# Altium schematic symbol library 13-Analog D 数模模数.SchLib: 573 symbols (part 4 of 6)
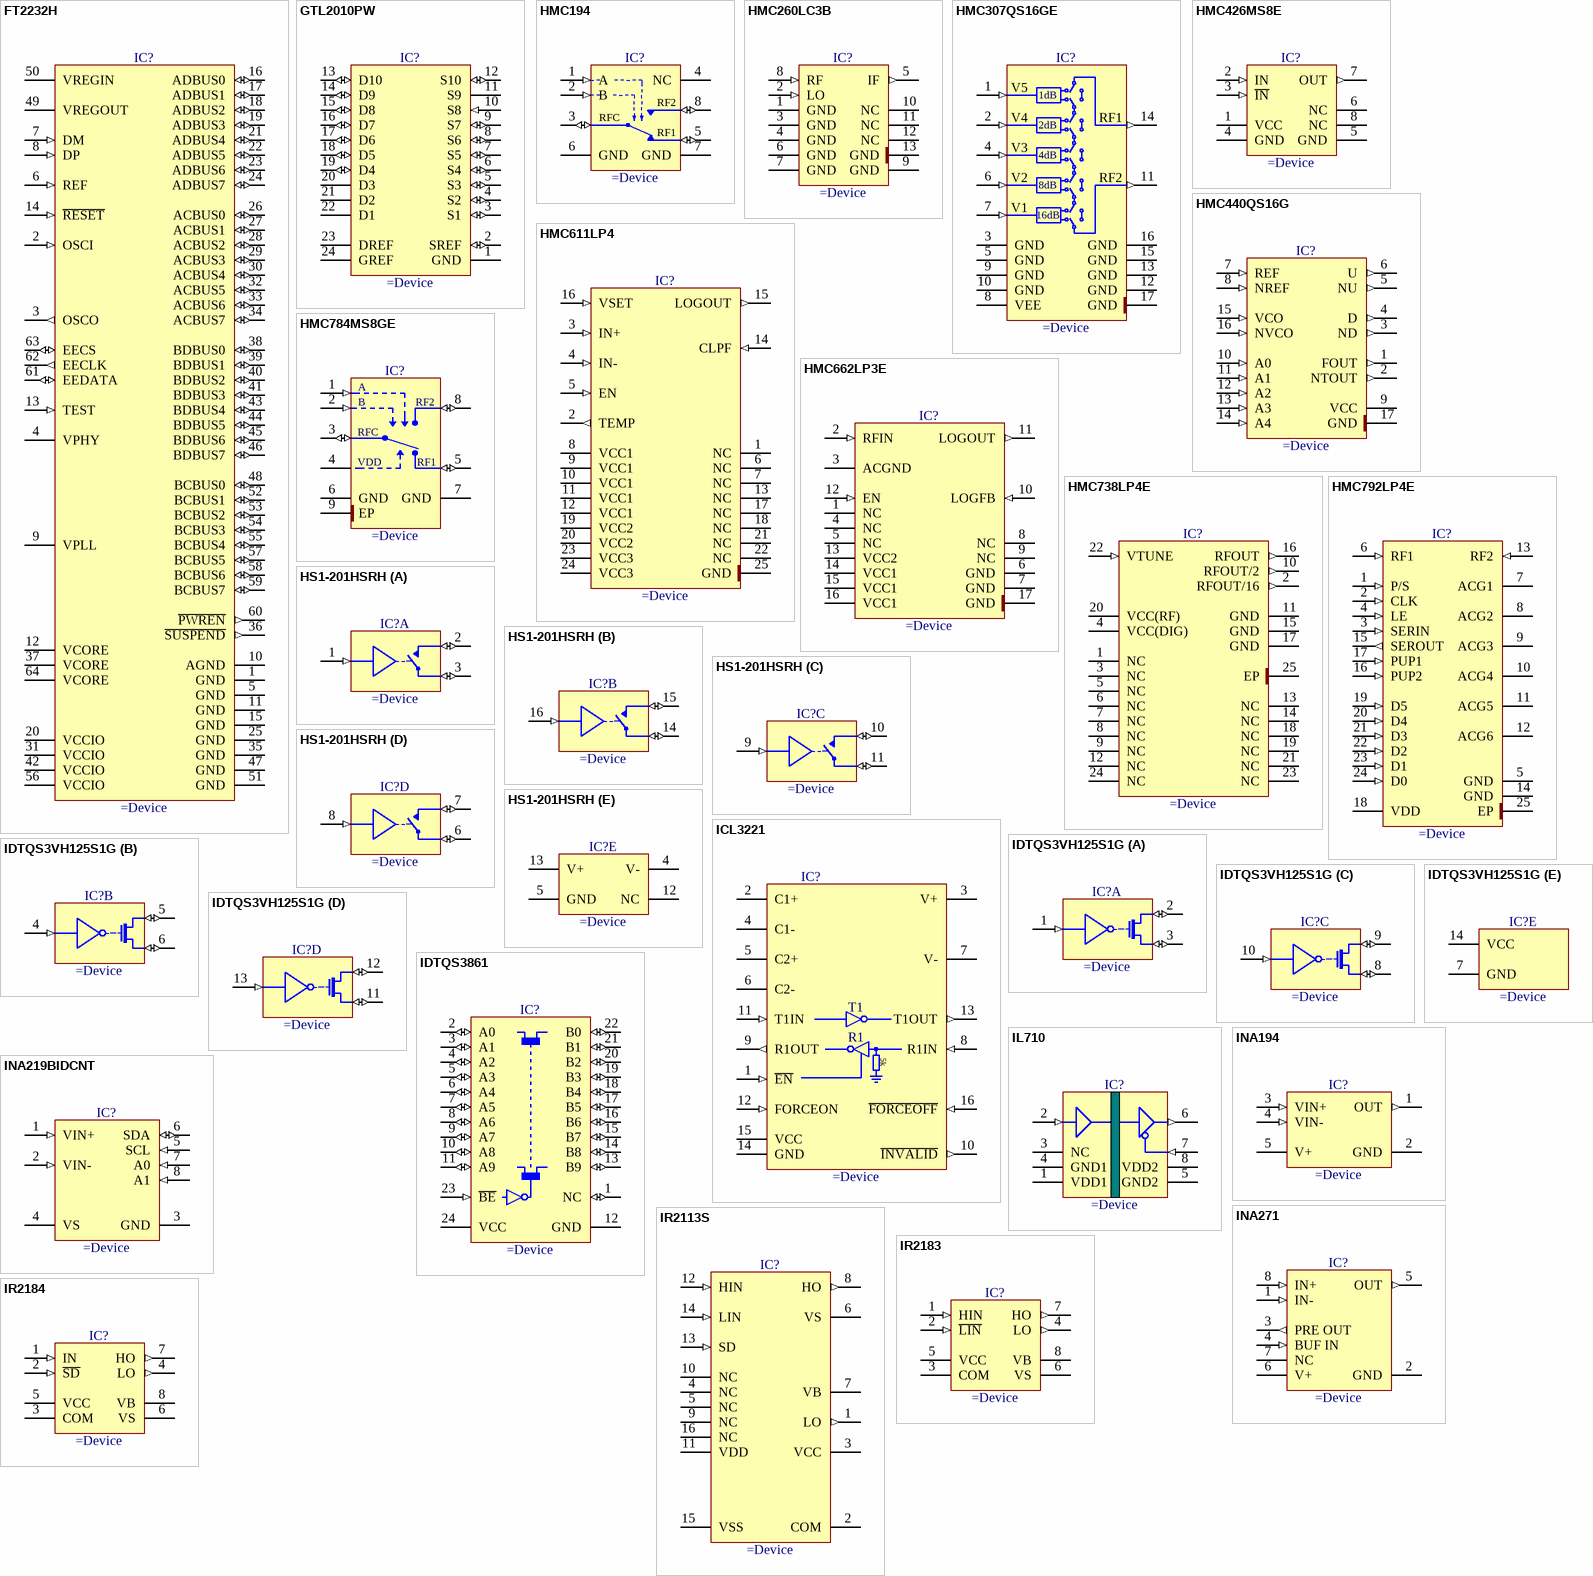
[diagram p43: symbols FT2232H to IR2184]

## HMC194
designator IC?
DC-3GHz GaAs MMIC SPDT Switch
pins: 1 A (in), 2 B (in), 3 RFC (io), 4 NC, 5 RF1 (io), 6 GND (power), 7 GND (power), 8 RF2 (io)

## HMC260LC3B
designator IC?
GaAs MMIC Fundamental Mixer, 14 - 26 GHz
pins: 1 GND (power), 2 LO (in), 3 GND (power), 4 GND (power), 5 IF (out), 6 GND (power), 7 GND (power), 8 RF (in), 9 GND (power), 10 NC, 11 NC, 12 NC, 13 GND (power)

## HMC307QS16GE
designator IC?
DC-4GHz, 1dB LSB GaAs MMIC 5-BIT Digital Attenuator
pins: 1 V5 (in), 2 V4 (in), 3 GND (power), 4 V3 (in), 5 GND (power), 6 V2 (in), 7 V1 (in), 8 VEE (power), 9 GND (power), 10 GND (power), 11 RF2 (out), 12 GND (power), 13 GND (power), 14 RF1 (out), 15 GND (power), 16 GND (power), 17 GND (power)
text: 1dB; 2dB; 4dB; 8dB; 16dB

## HMC426MS8E
designator IC?
SiGe MMIC Divide-by-4 Static Dividers, DC - 4 GHz
pins: 1 VCC (power), 2 IN (in), 3 ~{IN} (in), 4 GND (power), 5 GND (power), 6 NC, 7 OUT (out), 8 NC

## HMC440QS16G
designator IC?
2.8 GHz Integer-N Synthesizer (N = 2 - 32)
pins: 1 FOUT (out), 2 NTOUT (out), 3 ND (out), 4 D (out), 5 NU (out), 6 U (out), 7 REF (in), 8 NREF (in), 9 VCC (power), 10 A0 (in), 11 A1 (in), 12 A2 (in), 13 A3 (in), 14 A4 (in), 15 VCO (in), 16 NVCO (in), 17 GND (power)

## HMC611LP4
designator IC?
60 dB, Logarithmic Detector/ Controller, 1 to 10GHz
pins: 1 NC, 2 TEMP (out), 3 IN+ (in), 4 IN- (in), 5 EN (in), 6 NC, 7 NC, 8 VCC1 (power), 9 VCC1 (power), 10 VCC1 (power), 11 VCC1 (power), 12 VCC1 (power), 13 NC, 14 CLPF (in), 15 LOGOUT (out), 16 VSET (in), 17 NC, 18 NC, 19 VCC2 (power), 20 VCC2 (power), 21 NC, 22 NC, 23 VCC3 (power), 24 VCC3 (power), 25 GND (power)

## HMC662LP3E
designator IC?
54 dB, Logarithmic Detector, 8 to 30GHz
pins: 1 NC, 2 RFIN (in), 3 ACGND (power), 4 NC, 5 NC, 6 GND (power), 7 GND (power), 8 NC, 9 NC, 10 LOGFB (in), 11 LOGOUT (out), 12 EN (in), 13 VCC2 (power), 14 VCC1 (power), 15 VCC1 (power), 16 VCC1 (power), 17 GND (power)

## HMC738LP4E
designator IC?
MMIC VCO With Half Frequency Output & Divider-by-16, 20.9 - 23.9 GHz
pins: 1 NC, 2 RFOUT/16 (out), 3 NC, 4 VCC(DIG) (power), 5 NC, 6 NC, 7 NC, 8 NC, 9 NC, 10 RFOUT/2 (out), 11 GND (power), 12 NC, 13 NC, 14 NC, 15 GND (power), 16 RFOUT (out), 17 GND (power), 18 NC, 19 NC, 20 VCC(RF) (power), 21 NC, 22 VTUNE (in), 23 NC, 24 NC, 25 EP (power)

## HMC784MS8GE
designator IC?
GaAs MMIC 10 Watt T/R Switch DC - 4 GHz
pins: 1 A (in), 2 B (in), 3 RFC (io), 4 VDD (power), 5 RF1 (io), 6 GND (power), 7 GND (power), 8 RF2 (io), 9 EP (power)

## HMC792LP4E
designator IC?
0.25 dB LSB GaAs MMIC 6-Bit Digital Attenuator
pins: 1 P/S (in), 2 CLK (in), 3 SERIN (in), 4 LE (in), 5 GND (power), 6 RF1 (in), 7 ACG1, 8 ACG2, 9 ACG3, 10 ACG4, 11 ACG5, 12 ACG6, 13 RF2 (in), 14 GND (power), 15 SEROUT (out), 16 PUP2 (in), 17 PUP1 (in), 18 VDD (power), 19 D5 (in), 20 D4 (in), 21 D3 (in), 22 D2 (in), 23 D1 (in), 24 D0 (in), 25 EP (power)

## HS1-201HSRH
designator IC?
Radiation Hardened High Speed, Quad SPST CMOS Analog  Switch
part A pins: 1 A (in), 2 OUT (io), 3 IN (io)
part B pins: 14 IN (io), 15 OUT (io), 16 A (in)
part C pins: 9 A (in), 10 OUT (io), 11 IN (io)
part D pins: 6 IN (io), 7 OUT (io), 8 A (in)
part E pins: 4 V- (power), 5 GND (power), 12 NC (power), 13 V+ (power)

## ICL3221
designator IC?
One Microamp Supply-Current, +3V to +5.5V, 250kbps, RS-232 Transmitters/Receivers
pins: 1 ~{EN} (in), 2 C1+, 3 V+ (power), 4 C1-, 5 C2+, 6 C2-, 7 V- (power), 8 R1IN (in), 9 R1OUT (out), 10 ~{INVALID} (out), 11 T1IN (in), 12 FORCEON (in), 13 T1OUT (out), 14 GND (power), 15 VCC (power), 16 ~{FORCEOFF} (in)
text: T1; R1; 5k

## IDTQS3VH125S1G
designator IC?
QuickSwitch 2.5V / 3.3V Quad Active Low, High Bandwidth Bus Switch
part A pins: 1 ~{OE} (in), 2 A (io), 3 Y (io)
part B pins: 4 ~{OE} (in), 5 A (io), 6 Y (io)
part C pins: 8 Y (io), 9 A (io), 10 ~{OE} (in)
part D pins: 11 Y (io), 12 A (io), 13 ~{OE} (in)
part E pins: 7 GND (power), 14 VCC (power)

## IDTQS3861
designator IC?
High-Speed CMOS 10-Bit Bus Switch With Flow-Through Pinout (QUICKSWITCH® Product)
pins: 1 NC (io), 2 A0 (io), 3 A1 (io), 4 A2 (io), 5 A3 (io), 6 A4 (io), 7 A5 (io), 8 A6 (io), 9 A7 (io), 10 A8 (io), 11 A9 (io), 12 GND (power), 13 B9 (io), 14 B8 (io), 15 B7 (io), 16 B6 (io), 17 B5 (io), 18 B4 (io), 19 B3 (io), 20 B2 (io), 21 B1 (io), 22 B0 (io), 23 ~{BE} (in), 24 VCC (power)

## IL710
designator IC?
High Speed/High Temperature Digital Isolators
pins: 1 VDD1 (power), 2 IN (in), 3 NC, 4 GND1 (power), 5 GND2 (power), 6 OUT (out), 7 ~{OE} (in), 8 VDD2 (power)

## INA194
designator IC?
Current Shunt Monitor -16V to +80V Common-Mode Range
pins: 1 OUT (out), 2 GND (power), 3 VIN+ (in), 4 VIN- (in), 5 V+ (power)

## INA219BIDCNT
designator IC?
Zero-Drift, Bi-Directional CURRENT/POWER MONITOR with I2C™ Interface
pins: 1 VIN+ (in), 2 VIN- (in), 3 GND (power), 4 VS (power), 5 SCL (in), 6 SDA (io), 7 A0 (in), 8 A1 (in)

## INA271
designator IC?
Voltage Output, Unidirectional Measurement Current-Shunt Monitor
pins: 1 IN- (in), 2 GND (power), 3 PRE OUT (out), 4 BUF IN (in), 5 OUT (out), 6 V+ (power), 7 NC, 8 IN+ (in)

## IR2113S
designator IC?
High And Low Side Driver
pins: 1 LO (out), 2 COM (power), 3 VCC (power), 4 NC, 5 NC, 6 VS (power), 7 VB (power), 8 HO (out), 9 NC, 10 NC, 11 VDD (power), 12 HIN (in), 13 SD (in), 14 LIN (in), 15 VSS (power), 16 NC

## IR2183
designator IC?
Half-Bridge Driver
pins: 1 HIN (in), 2 ~{LIN} (in), 3 COM (power), 4 LO (out), 5 VCC (power), 6 VS (power), 7 HO (out), 8 VB (power)

## IR2184
designator IC?
Half-Bridge Driver
pins: 1 IN (in), 2 ~{SD} (in), 3 COM (power), 4 LO (out), 5 VCC (power), 6 VS (power), 7 HO (out), 8 VB (power)

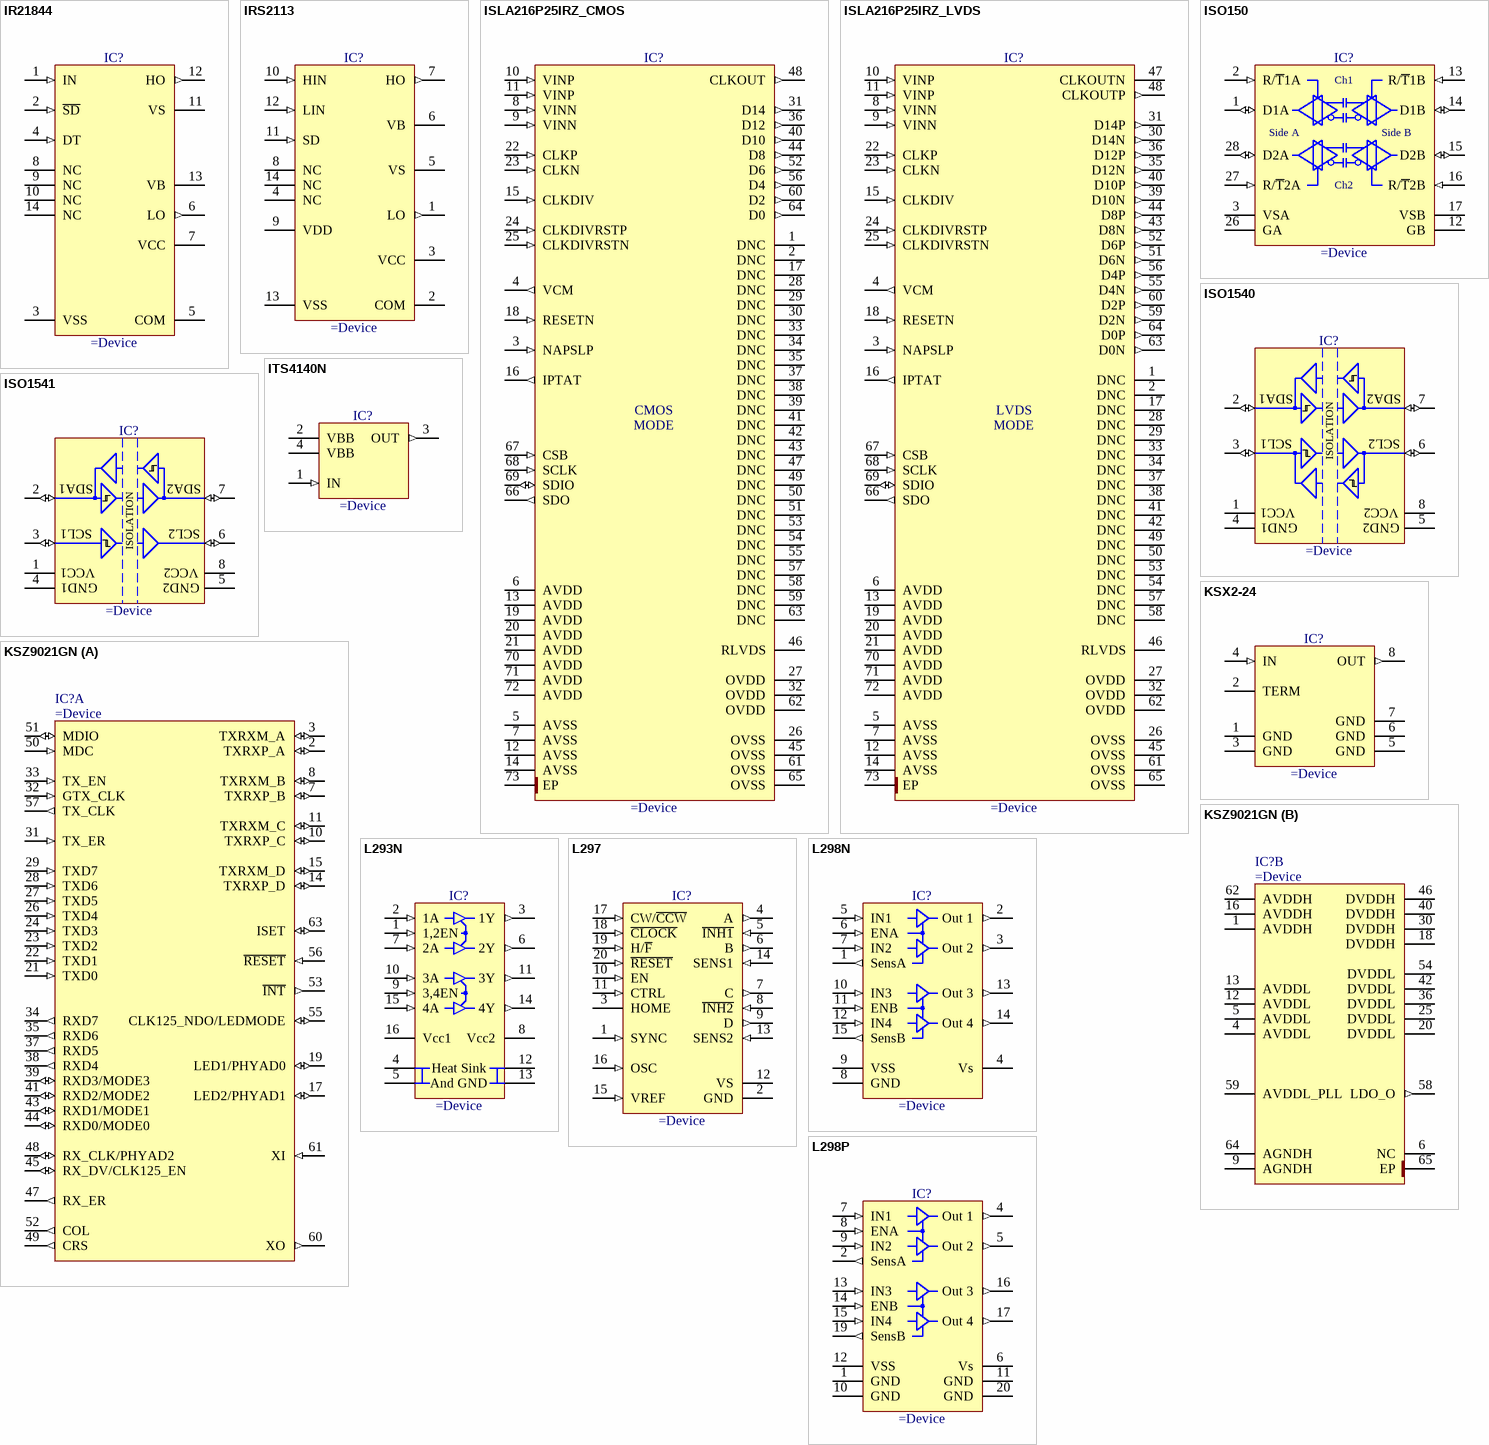
[diagram p22: symbols IR21844 to L298P]

## IR21844
designator IC?
Half-Bridge Driver
pins: 1 IN (in), 2 ~{SD} (in), 3 VSS (power), 4 DT (in), 5 COM (power), 6 LO (out), 7 VCC (power), 8 NC, 9 NC, 10 NC, 11 VS (power), 12 HO (out), 13 VB (power), 14 NC

## IRS2113
designator IC?
High And Low Side Driver
pins: 1 LO (out), 2 COM (power), 3 VCC (power), 4 NC, 5 VS (power), 6 VB (power), 7 HO (out), 8 NC, 9 VDD (power), 10 HIN (in), 11 SD (in), 12 LIN (in), 13 VSS (power), 14 NC

## ISLA216P25IRZ_CMOS
designator IC?
16-Bit, 250MSPS ADC (CMOS Mode)
pins: 1 DNC, 2 DNC, 3 NAPSLP (in), 4 VCM (out), 5 AVSS (power), 6 AVDD (power), 7 AVSS (power), 8 VINN (in), 9 VINN (in), 10 VINP (in), 11 VINP (in), 12 AVSS (power), 13 AVDD (power), 14 AVSS (power), 15 CLKDIV (in), 16 IPTAT (out), 17 DNC, 18 RESETN (in), 19 AVDD (power), 20 AVDD (power), 21 AVDD (power), 22 CLKP (in), 23 CLKN (in), 24 CLKDIVRSTP (in), 25 CLKDIVRSTN (in), 26 OVSS (power), 27 OVDD (power), 28 DNC, 29 DNC, 30 DNC, 31 D14 (out), 32 OVDD (power), 33 DNC, 34 DNC, 35 DNC, 36 D12 (out), 37 DNC, 38 DNC, 39 DNC, 40 D10 (out), 41 DNC, 42 DNC, 43 DNC, 44 D8 (out), 45 OVSS (power), 46 RLVDS, 47 DNC (oc), 48 CLKOUT (out), 49 DNC, 50 DNC, 51 DNC, 52 D6 (out), 53 DNC, 54 DNC, 55 DNC, 56 D4 (out), 57 DNC, 58 DNC, 59 DNC, 60 D2 (out), 61 OVSS (power), 62 OVDD (power), 63 DNC, 64 D0 (out), 65 OVSS (power), 66 SDO (out), 67 CSB (in), 68 SCLK (in), 69 SDIO (io), 70 AVDD (power), 71 AVDD (power), 72 AVDD (power), 73 EP (power)
text: CMOS; MODE

## ISLA216P25IRZ_LVDS
designator IC?
16-Bit, 250MSPS ADC (LVDS Mode)
pins: 1 DNC, 2 DNC, 3 NAPSLP (in), 4 VCM (out), 5 AVSS (power), 6 AVDD (power), 7 AVSS (power), 8 VINN (in), 9 VINN (in), 10 VINP (in), 11 VINP (in), 12 AVSS (power), 13 AVDD (power), 14 AVSS (power), 15 CLKDIV (in), 16 IPTAT (out), 17 DNC, 18 RESETN (in), 19 AVDD (power), 20 AVDD (power), 21 AVDD (power), 22 CLKP (in), 23 CLKN (in), 24 CLKDIVRSTP (in), 25 CLKDIVRSTN (in), 26 OVSS (power), 27 OVDD (power), 28 DNC, 29 DNC, 30 D14N (out), 31 D14P (out), 32 OVDD (power), 33 DNC, 34 DNC, 35 D12N (out), 36 D12P (out), 37 DNC, 38 DNC, 39 D10N (out), 40 D10P (out), 41 DNC, 42 DNC, 43 D8N (out), 44 D8P (out), 45 OVSS (power), 46 RLVDS, 47 CLKOUTN (oc), 48 CLKOUTP (out), 49 DNC, 50 DNC, 51 D6N (out), 52 D6P (out), 53 DNC, 54 DNC, 55 D4N (out), 56 D4P (out), 57 DNC, 58 DNC, 59 D2N (out), 60 D2P (out), 61 OVSS (power), 62 OVDD (power), 63 D0N (out), 64 D0P (out), 65 OVSS (power), 66 SDO (out), 67 CSB (in), 68 SCLK (in), 69 SDIO (io), 70 AVDD (power), 71 AVDD (power), 72 AVDD (power), 73 EP (power)
text: LVDS; MODE

## ISO150
designator IC?
Dual, Isolated, Bi-Directional Digital Coupler
pins: 1 D1A (io), 2 R/~{T}1A (in), 3 VSA (power), 12 GB (power), 13 R/~{T}1B (in), 14 D1B (io), 15 D2B (io), 16 R/~{T}2B (in), 17 VSB (power), 26 GA (power), 27 R/~{T}2A (in), 28 D2A (io)
text: Ch1; Side A; Side B; Ch2

## ISO1540
designator IC?
Low-Power Bi-Directional I2C Isolator
pins: 1 VCC1 (power), 2 SDA1 (io), 3 SCL1 (io), 4 GND1 (power), 5 GND2 (power), 6 SCL2 (io), 7 SDA2 (io), 8 VCC2 (power)
text: ISOLATION

## ISO1541
designator IC?
Low-Power Bi-Directional I2C Isolator
pins: 1 VCC1 (power), 2 SDA1 (io), 3 SCL1 (io), 4 GND1 (power), 5 GND2 (power), 6 SCL2 (io), 7 SDA2 (io), 8 VCC2 (power)
text: ISOLATION

## ITS4140N
designator IC?
0.2A Smart High-Side Power Switch for Industrial Applications One channel: 1 x 1 Ohm
pins: 1 IN (in), 2 VBB (power), 3 OUT (out), 4 VBB (power)

## KSX2-24
designator IC?
50 OHM 10 to 20GHz Frequency Multiplier
pins: 1 GND (power), 2 TERM, 3 GND (power), 4 IN (in), 5 GND (power), 6 GND (power), 7 GND (power), 8 OUT (out)

## KSZ9021GN
designator IC?
Gigabit Ethernet Tranceiver With GMII / MII Support
part A pins: 2 TXRXP_A (io), 3 TXRXM_A (io), 7 TXRXP_B (io), 8 TXRXM_B (io), 10 TXRXP_C (io), 11 TXRXM_C (io), 14 TXRXP_D (io), 15 TXRXM_D (io), 17 LED2/PHYAD1 (io), 19 LED1/PHYAD0 (io), 21 TXD0 (in), 22 TXD1 (in), 23 TXD2 (in), 24 TXD3 (in), 26 TXD4 (in), 27 TXD5 (in), 28 TXD6 (in), 29 TXD7 (in), 31 TX_ER (in), 32 GTX_CLK (in), 33 TX_EN (in), 34 RXD7 (out), 35 RXD6 (out), 37 RXD5 (out), 38 RXD4 (out), 39 RXD3/MODE3 (io), 41 RXD2/MODE2 (io), 43 RXD1/MODE1 (io), 44 RXD0/MODE0 (io), 45 RX_DV/CLK125_EN (io), 47 RX_ER (out), 48 RX_CLK/PHYAD2 (io), 49 CRS (out), 50 MDC (in), 51 MDIO (io), 52 COL (out), 53 ~{INT} (out), 55 CLK125_NDO/LEDMODE (io), 56 ~{RESET} (in), 57 TX_CLK (out), 60 XO (out), 61 XI (in), 63 ISET (io)
part B pins: 1 AVDDH (power), 4 AVDDL (power), 5 AVDDL (power), 6 NC, 9 AGNDH (power), 12 AVDDL (power), 13 AVDDL (power), 16 AVDDH (power), 18 DVDDH (power), 20 DVDDL (power), 25 DVDDL (power), 30 DVDDH (power), 36 DVDDL (power), 40 DVDDH (power), 42 DVDDL (power), 46 DVDDH (power), 54 DVDDL (power), 58 LDO_O (out), 59 AVDDL_PLL (power), 62 AVDDH (power), 64 AGNDH (power), 65 EP (power)

## L293N
designator IC?
Quadruple Half-H Drivers
pins: 1 1,2EN (in), 2 1A (in), 3 1Y (out), 4 HS GND (power), 5 HS GND (power), 6 2Y (out), 7 2A (in), 8 Vcc2 (power), 9 3,4EN (in), 10 3A (in), 11 3Y (out), 12 HS GND (power), 13 HS GND (power), 14 4Y (out), 15 4A (in), 16 Vcc1 (power)
text: Heat Sink; And GND

## L297
designator IC?
Stepper Motor Controller
pins: 1 SYNC (in), 2 GND (power), 3 HOME (oc), 4 A (out), 5 ~{INH1} (in), 6 B (out), 7 C (out), 8 ~{INH2} (in), 9 D (out), 10 EN (in), 11 CTRL (in), 12 VS (power), 13 SENS2 (in), 14 SENS1 (in), 15 VREF (in), 16 OSC (in), 17 CW/~{CCW} (in), 18 ~{CLOCK} (in), 19 H/~{F} (in), 20 ~{RESET} (in)

## L298N
designator IC?
Dual Full-Bridge Driver
pins: 1 SensA (out), 2 Out 1 (out), 3 Out 2 (out), 4 Vs (power), 5 IN1 (in), 6 ENA (in), 7 IN2 (in), 8 GND (power), 9 VSS (power), 10 IN3 (in), 11 ENB (in), 12 IN4 (in), 13 Out 3 (out), 14 Out 4 (out), 15 SensB (out)

## L298P
designator IC?
Dual Full-Bridge Driver
pins: 1 GND (power), 2 SensA (out), 4 Out 1 (out), 5 Out 2 (out), 6 Vs (power), 7 IN1 (in), 8 ENA (in), 9 IN2 (in), 10 GND (power), 11 GND (power), 12 VSS (power), 13 IN3 (in), 14 ENB (in), 15 IN4 (in), 16 Out 3 (out), 17 Out 4 (out), 19 SensB (out), 20 GND (power)

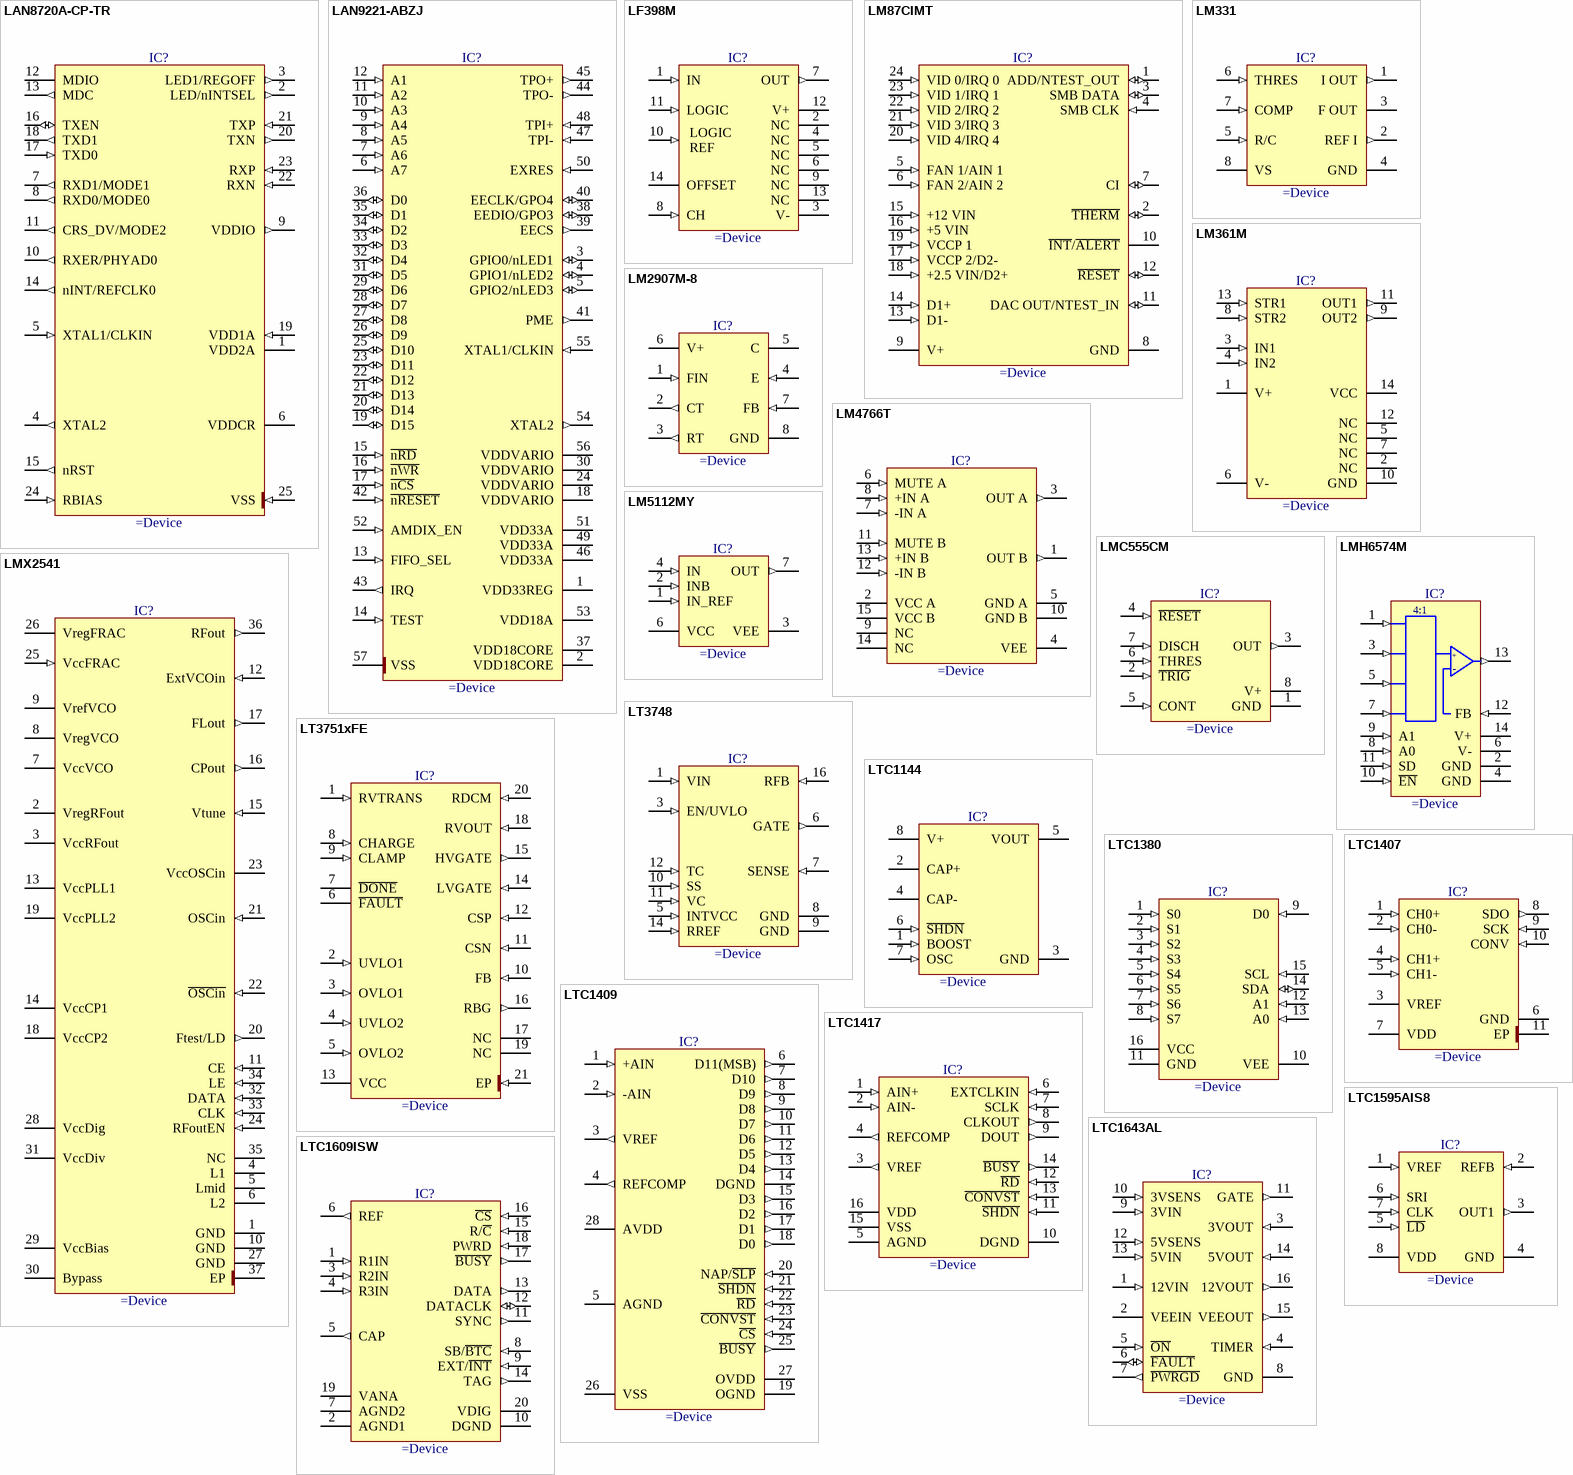
[diagram p23: symbols LAN8720A-CP-TR to LTC1643AL]

## LAN8720A-CP-TR
designator IC?
Small Footprint RMII 10/100 Ethernet Transceiver with HP Auto-MDIX
pins: 1 VDD2A (power), 2 LED/nINTSEL (out), 3 LED1/REGOFF (out), 4 XTAL2 (out), 5 XTAL1/CLKIN (in), 6 VDDCR (power), 7 RXD1/MODE1 (out), 8 RXD0/MODE0 (out), 9 VDDIO (out), 10 RXER/PHYAD0 (out), 11 CRS_DV/MODE2 (out), 12 MDIO (power), 13 MDC (out), 14 nINT/REFCLK0 (out), 15 nRST (out), 16 TXEN (io), 17 TXD0 (in), 18 TXD1 (out), 19 VDD1A (in), 20 TXN (out), 21 TXP (in), 22 RXN (in), 23 RXP (in), 24 RBIAS (in), 25 VSS (in)

## LAN9221-ABZJ
designator IC?
High-Performance 16-bit Non-PCI 10/100 Ethernet Controller with Variable Voltage I/O
pins: 1 VDD33REG (power), 2 VDD18CORE (power), 3 GPIO0/nLED1 (io), 4 GPIO1/nLED2 (io), 5 GPIO2/nLED3 (io), 6 A7 (in), 7 A6 (in), 8 A5 (in), 9 A4 (in), 10 A3 (in), 11 A2 (in), 12 A1 (in), 13 FIFO_SEL (in), 14 TEST (in), 15 ~{nRD} (in), 16 ~{nWR} (in), 17 ~{nCS} (in), 18 VDDVARIO (power), 19 D15 (io), 20 D14 (io), 21 D13 (io), 22 D12 (io), 23 D11 (io), 24 VDDVARIO (power), 25 D10 (io), 26 D9 (io), 27 D8 (io), 28 D7 (io), 29 D6 (io), 30 VDDVARIO (power), 31 D5 (io), 32 D4 (io), 33 D3 (io), 34 D2 (io), 35 D1 (io), 36 D0 (io), 37 VDD18CORE (power), 38 EEDIO/GPO3 (io), 39 EECS (out), 40 EECLK/GPO4 (io), 41 PME (out), 42 ~{nRESET} (in), 43 IRQ (out), 44 TPO- (out), 45 TPO+ (out), 46 VDD33A (power), 47 TPI- (in), 48 TPI+ (in), 49 VDD33A (power), 50 EXRES (in), 51 VDD33A (power), 52 AMDIX_EN (in), 53 VDD18A (power), 54 XTAL2 (out), 55 XTAL1/CLKIN (in), 56 VDDVARIO (power), 57 VSS (power)

## LF398M
designator IC?
Monolithic Sample-and-Hold Circuit
pins: 1 IN (in), 2 NC, 3 V- (power), 4 NC, 5 NC, 6 NC, 7 OUT (out), 8 CH (in), 9 NC, 10 LOGICREF (in), 11 LOGIC (in), 12 V+ (power), 13 NC, 14 OFFSET (power)
text: REF

## LM87CIMT
designator IC?
Serial Interface System Hardware Monitor With Remote Diode Temperature Sensing
pins: 1 ADD/NTEST_OUT (io), 2 ~{THERM} (io), 3 SMB DATA (io), 4 SMB CLK (in), 5 FAN 1/AIN 1 (in), 6 FAN 2/AIN 2 (in), 7 CI (io), 8 GND (power), 9 V+ (power), 10 ~{INT}/~{ALERT} (oe), 11 DAC OUT/NTEST_IN (io), 12 ~{RESET} (io), 13 D1- (in), 14 D1+ (in), 15 +12 VIN (in), 16 +5 VIN (in), 17 VCCP 2/D2- (in), 18 +2.5 VIN/D2+ (in), 19 VCCP 1 (in), 20 VID 4/IRQ 4 (in), 21 VID 3/IRQ 3 (in), 22 VID 2/IRQ 2 (in), 23 VID 1/IRQ 1 (in), 24 VID 0/IRQ 0 (in)

## LM331
designator IC?
Precision Voltage-to-Frequency Converter
pins: 1 I OUT (out), 2 REF I (out) "Timming Capacitor", 3 F OUT (oc) "Timming Resistor", 4 GND (power), 5 R/C (in), 6 THRES (in), 7 COMP (in) "Feedback", 8 VS (power)

## LM361M
designator IC?
High Speed Differential Comparator
pins: 1 V+ (power), 2 NC, 3 IN1 (in), 4 IN2 (in), 5 NC, 6 V- (power), 7 NC, 8 STR2 (in), 9 OUT2 (out), 10 GND (power), 11 OUT1 (out), 12 NC, 13 STR1 (in), 14 VCC (power)

## LM2907M-8
designator IC?
Frequency to Voltage Converter
pins: 1 FIN (in), 2 CT (out) "Timming Capacitor", 3 RT (out) "Timming Resistor", 4 E (in), 5 C (power), 6 V+ (power), 7 FB (in) "Feedback", 8 GND (power)

## LM4766T
designator IC?
Dual 40W Audio Power Amplifier with Mute
pins: 1 OUT B (out), 2 VCC A (power), 3 OUT A (out), 4 VEE (power), 5 GND A (power), 6 MUTE A (in), 7 -IN A (in), 8 +IN A (in), 9 NC, 10 GND B (power), 11 MUTE B (in), 12 -IN B (in), 13 +IN B (in), 14 NC, 15 VCC B (power)

## LM5112MY
designator IC?
Tiny 7A MOSFET Gate Driver
pins: 1 IN_REF (in), 2 INB (in), 3 VEE (power), 4 IN (in), 6 VCC (power), 7 OUT (out)

## LMC555CM
designator IC?
CMOS Timer
pins: 1 GND (power), 2 ~{TRIG} (in), 3 OUT (out), 4 ~{RESET} (in), 5 CONT (in), 6 THRES (in), 7 DISCH (in), 8 V+ (power)

## LMH6574M
designator IC?
4:1 High Speed Video Multiplexer
pins: 1 IN0 (in), 2 GND (power), 3 IN1 (in), 4 GND (power), 5 IN2 (in), 6 V- (power), 7 IN3 (in), 8 A0 (in), 9 A1 (in), 10 ~{EN} (in), 11 SD (in), 12 FB (in), 13 OUT (out), 14 V+ (power)
text: 4:1; +; -
